# Altium footprint library GyokuRe.PcbLib: 1248 footprints (part 69 of 78)
Each footprint in its own frame and in the unit in brackets; x right, y up, seen from the top. Pads: shape width x height; smd on the part's side, far side on the other; paste and mask are expansions set on the pad; w line width, h text height; cw(c..) or ccw(c..) is an arc to the next point about the centre after c.
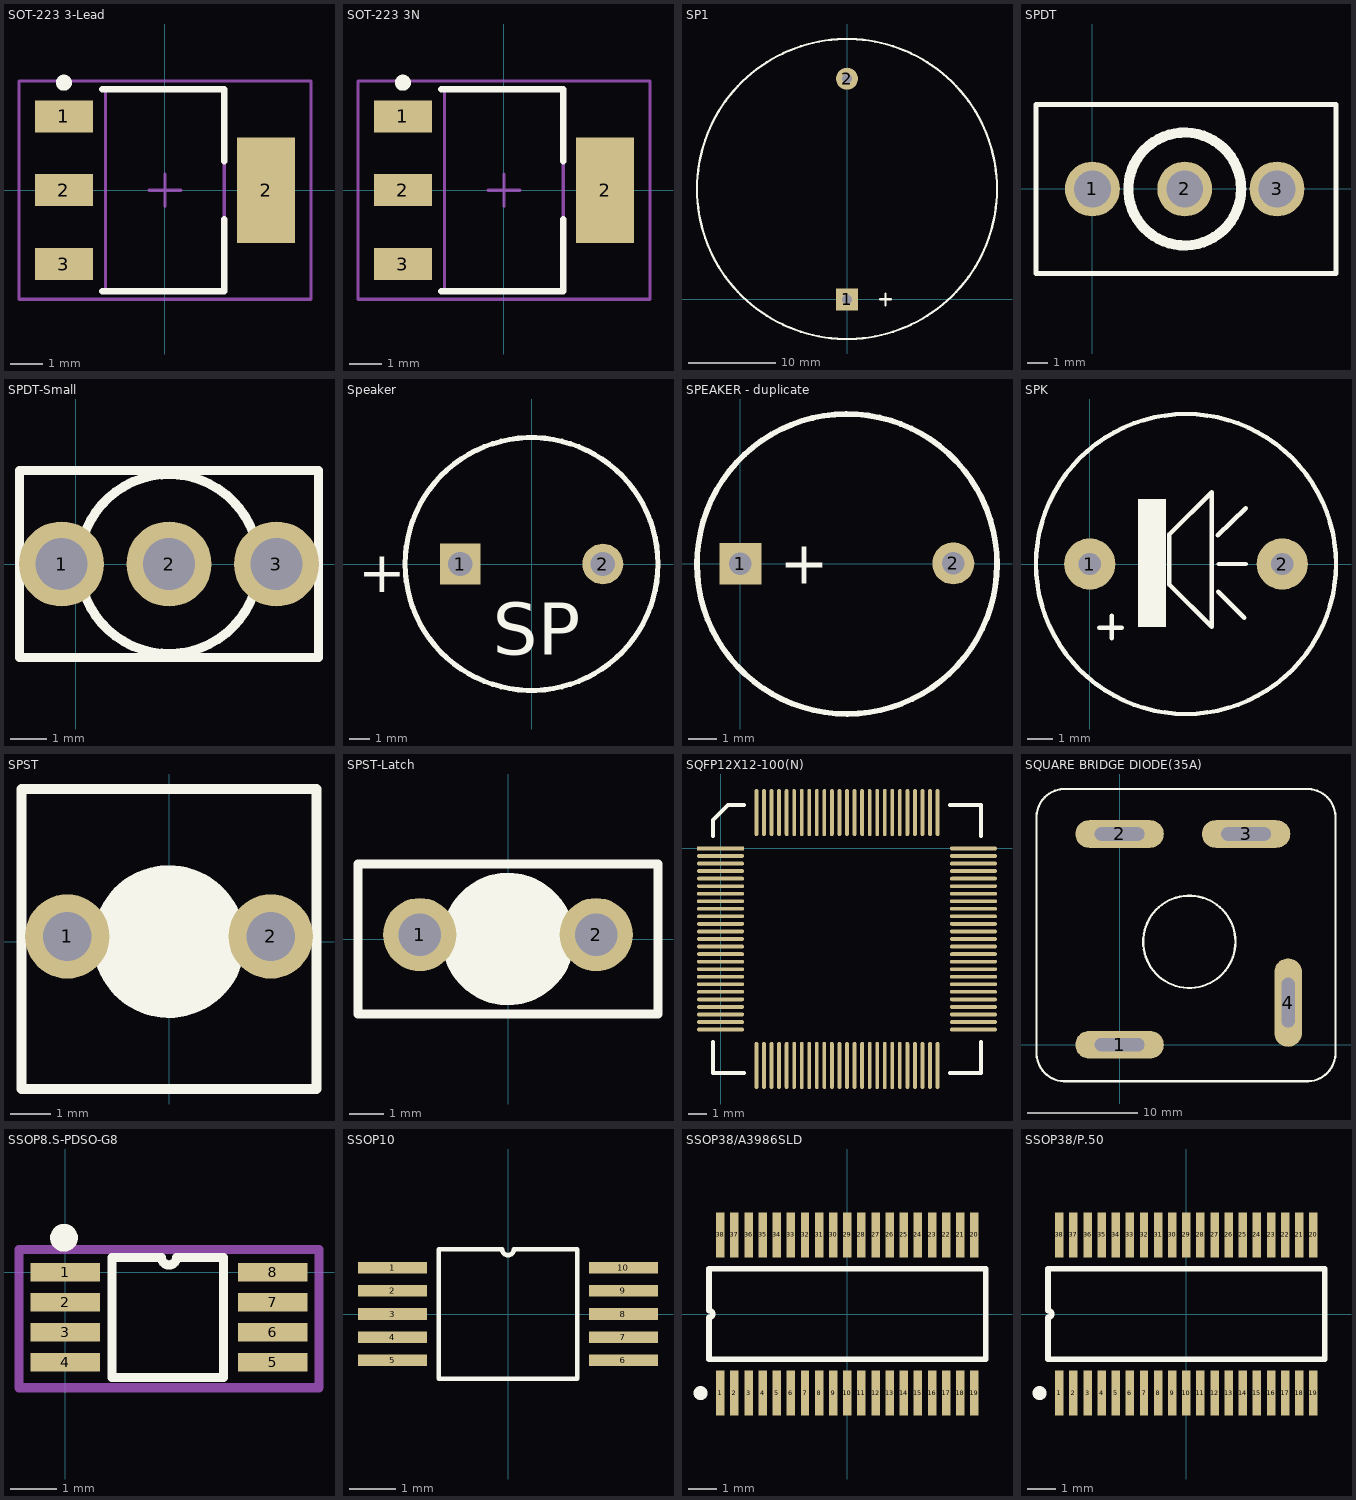
[diagram p68: the footprints below, top view; thin cyan lines are the x and y axes]

## SOT-223 3-Lead [mm]
height 1.8
pads (4):
  rect 1.8x1 smd: 1(-3.15,2.3) 2(-3.15,0) 3(-3.15,-2.3)
  rect 1.8x3.3 smd: 2(3.15,0)
Top Overlay:
  circle w0.25: c-3.15,3.35 r0.125
  lines w0.2: -1.95,-3.15 1.85,-3.15 1.85,-0.9 ; -1.95,3.15 1.85,3.15 1.85,0.9
Mechanical 13:
  lines w0.1: -1.85,-3.15 -1.85,3.15 1.85,3.15 1.85,-3.15 -1.85,-3.15
Mechanical 15:
  lines w0.1: -0.5,0 0.5,0 ; 0,-0.5 0,0.5 ; -4.55,-3.4 -4.55,3.4 4.55,3.4 4.55,-3.4 -4.55,-3.4
3D body: height 0.33, standoff 0.01, extent 1.825,-1.5 3.575,1.5
3D body: height 0.33, standoff 0.01, extent -3.55,-2.675 -1.8,-1.925
3D body: height 0.33, standoff 0.01, extent -3.55,-0.375 -1.8,0.375
3D body: height 0.33, standoff 0.01, extent -3.55,1.925 -1.8,2.675
3D body: height 1.75, standoff 0.1, extent -1.85,-3.15 1.85,3.15

## SOT-223 3N [mm]
height 1.8
pads (4):
  rect 1.8x1 smd: 1(-3.15,2.3) 2(-3.15,0) 3(-3.15,-2.3)
  rect 1.8x3.3 smd: 2(3.15,0)
Top Overlay:
  circle w0.25: c-3.15,3.35 r0.125
  lines w0.2: -1.95,-3.15 1.85,-3.15 1.85,-0.9 ; -1.95,3.15 1.85,3.15 1.85,0.9
Mechanical 13:
  lines w0.1: -1.85,-3.15 -1.85,3.15 1.85,3.15 1.85,-3.15 -1.85,-3.15
Mechanical 15:
  lines w0.1: -0.5,0 0.5,0 ; 0,-0.5 0,0.5 ; -4.55,-3.4 -4.55,3.4 4.55,3.4 4.55,-3.4 -4.55,-3.4
3D body "SOT-223-1.STEP": height 1.69, standoff 0.04, extent -3.525,-3.25 3.475,3.25

## SP1 [mil] "Speaker Telphone on Broad"
height 3
pads (2):
  rect 100x100 hole 45: 1(0,0)
  round 100 hole 45: 2(0,1000)
Top Overlay:
  circle w10: c0,500 r680
  lines w10: 150,0 200,0 ; 174,-28 174,26
3D body "Sonitron-SCS-32 p10-DEFAULT.STEP": height 382.53, standoff -227.75, extent -666.7,-174.54 652.2,1144.36

## SPDT [mil] "Single-Pole, Double-Throw Switch; Solder Pad 35mil"
pads (3):
  round 107 hole 72: 1(0,0) 2(180,0) 3(360,0)
Top Overlay:
  circle w20: c180,0 r110
  lines w10: -110,-165 475,-165 475,165 -110,165 -110,-165
3D body "SW3dPS-SWITCH SPDT_O_N_O.STEP": height 1126.73, standoff -95, extent -70,-233.46 430,233.47

## SPDT-Small [mil] "Single-Pole, Double-Throw Switch, Small Type; Solder Pad 35mil"
pads (3):
  round 91 hole 56: 1(-15,0) 2(100,0) 3(215,0)
Top Overlay:
  circle w10: c100,0 r96
  lines w10: -60,-100 260,-100 260,100 -60,100 -60,-100

## Speaker [mm] "Speaker footprint"
pads (2):
  rect 2x2 hole 1.2: 1(-3.5,0)
  round 2 hole 1.2: 2(3.5,0)
Top Overlay:
  circle w0.254: c0,0 r6.2
  text "+" at -8.509,-1.397 h2.03
  text "SP" at -1.905,-4.445 h2.54
Bottom Overlay:
  circle w0.254: c-0.025,0 r6.228
3D body: height 10.02, standoff 10, extent -2.025,-2.025 2.025,2.025
3D body: height 10, standoff 1, extent -6.2,-6.2 6.2,6.2

## SPEAKER - duplicate [mm]
pads (2):
  rect 1.5x1.5 hole 0.8: 1(0,0)
  round 1.5 hole 0.8: 2(7.62,0.013)
Top Overlay:
  lines w0.203: 7.724,3.67 ccw(c3.816,-0.008) 7.76,3.632
  text "+" at 1.41,-0.711 h1.52
3D body "User Library-Buzzer WST-1203UX.step": height 4.5, standoff -9.65, extent -2.215,-6 13.239,6

## SPK [mil] "Speaker Chip"
height 500
pads (2):
  round 80 hole 35: 1(0,0) 2(300,0)
Top Overlay:
  circle w7: c150,0 r233.73
  rectangle: 75,-98 119,101
  lines w7: 15,-99 50,-99 ; 34,-116 34,-81 ; 199.52,44.52 243,87 ; 200,-43 241,-84 ; 201,0 243,0 ; 124,-32 190,-98 190,112 124,46 124,-32
3D body "Sonitron-SCS-17 P10-DEFAULT.STEP": height 343.51, standoff -267.12, extent -221,-354.14 511.28,378.14

## SPST [mil] "Single-Pole, Single-Throw Switch; 2 Leads; Solder Pad 35mil"
pads (2):
  round 83 hole 48: 1(-100,5) 2(100,5)
Top Overlay:
  circle w80: c0,0 r35
  lines w10: -145,-145 -145,150 145,150 145,-145 -145,-145

## SPST-Latch [mil] "Single-Pole, Single-Throw Switch; 2 Leads; Solder Pad 35mil"
pads (2):
  round 83 hole 48: 1(-100,5) 2(100,5)
Top Overlay:
  circle w80: c0,0 r35
  lines w10: -170,-85 170,-85 170,85 -170,85 -170,-85

## SQFP12X12-100(N) [mm]
pads (100):
  rect 2.5x0.2 smd: 1(0,0)
  oval 2.5x0.2 smd: 2(0,-0.4) 3(0,-0.8) 4(0,-1.2) 5(0,-1.6) 6(0,-2) 7(0,-2.4) 8(0,-2.8) 9(0,-3.2) 10(0,-3.6) 11(0,-4) 12(0,-4.4) 13(0,-4.8) 14(0,-5.2) 15(0,-5.6) 16(0,-6) 17(0,-6.4) 18(0,-6.8) 19(0,-7.2) 20(0,-7.6) 21(0,-8) 22(0,-8.4) 23(0,-8.8) 24(0,-9.2) 25(0,-9.6) 51(13.4,-9.6) 52(13.4,-9.2) 53(13.4,-8.8) 54(13.4,-8.4) 55(13.4,-8) 56(13.4,-7.6) 57(13.4,-7.2) 58(13.4,-6.8) 59(13.4,-6.4) 60(13.4,-6) 61(13.4,-5.6) 62(13.4,-5.2) 63(13.4,-4.8) 64(13.4,-4.4) 65(13.4,-4) 66(13.4,-3.6) 67(13.4,-3.2) 68(13.4,-2.8) 69(13.4,-2.4) 70(13.4,-2) 71(13.4,-1.6) 72(13.4,-1.2) 73(13.4,-0.8) 74(13.4,-0.4) 75(13.4,0)
  oval 0.2x2.5 smd: 26(1.9,-11.5) 27(2.3,-11.5) 28(2.7,-11.5) 29(3.1,-11.5) 30(3.5,-11.5) 31(3.9,-11.5) 32(4.3,-11.5) 33(4.7,-11.5) 34(5.1,-11.5) 35(5.5,-11.5) 36(5.9,-11.5) 37(6.3,-11.5) 38(6.7,-11.5) 39(7.1,-11.5) 40(7.5,-11.5) 41(7.9,-11.5) 42(8.3,-11.5) 43(8.7,-11.5) 44(9.1,-11.5) 45(9.5,-11.5) 46(9.9,-11.5) 47(10.3,-11.5) 48(10.7,-11.5) 49(11.1,-11.5) 50(11.5,-11.5) 76(11.5,1.9) 77(11.1,1.9) 78(10.7,1.9) 79(10.3,1.9) 80(9.9,1.9) 81(9.5,1.9) 82(9.1,1.9) 83(8.7,1.9) 84(8.3,1.9) 85(7.9,1.9) 86(7.5,1.9) 87(7.1,1.9) 88(6.7,1.9) 89(6.3,1.9) 90(5.9,1.9) 91(5.5,1.9) 92(5.1,1.9) 93(4.7,1.9) 94(4.3,1.9) 95(3.9,1.9) 96(3.5,1.9) 97(3.1,1.9) 98(2.7,1.9) 99(2.3,1.9) 100(1.9,1.9)
Top Overlay:
  lines w0.2: -0.4,-10.25 -0.4,-11.9 1.25,-11.9 ; -0.4,0.65 -0.4,1.5 0.4,2.3 1.25,2.3 ; 12.15,-11.9 13.8,-11.9 13.8,-10.25 ; 12.15,2.3 13.8,2.3 13.8,0.65

## SQUARE BRIDGE DIODE(35A) [mm]
pads (4):
  oval 8x2.5 hole 1.2 slot 4.5 at 0 deg: 1(0,0) 2(0,19.05) 3(11.43,19.05)
  oval 2.5x8 hole 1.2 slot 4.5 at 90 deg: 4(15.24,3.81)
Top Overlay:
  circle w0.2: c6.303,9.304 r4.17
  lines w0.2: -7.504,-0.6 ccw(c-4.952,-0.75) -4.802,-3.302 16.808,-3.302 ccw(c16.958,-0.75) 19.509,-0.6 19.509,20.41 ccw(c16.958,20.56) 16.808,23.111 -4.802,23.111 ccw(c-4.952,20.56) -7.504,20.41 -7.504,-0.6
3D body "User Library-SquareDiodeBridge-L.step": height 8.05, standoff -11, extent -8.281,-4.217 20.219,24.283

## SSOP8.S-PDSO-G8 [mm]
pads (8):
  rect 1.5x0.4 smd: 1(0,0) 2(0,-0.65) 3(0,-1.3) 4(0,-1.95) 5(4.5,-1.95) 6(4.5,-1.3) 7(4.5,-0.65) 8(4.5,0)
Top Overlay:
  lines w0.2: 1.016,-2.275 1.016,0.325 2.088,0.325 ccw(c2.25,0.325) 2.412,0.325 3.429,0.325 3.429,-2.275 1.016,-2.275
  lines w0.3: 0.125,0.75 cw(c-0.025,0.75) 0.124,0.767
Mechanical 13:
  lines w0.2: -1,-2.5 5.5,-2.5 5.5,0.5 -1,0.5 -1,-2.5
3D body: height 1.2, standoff 1.1, extent 1.049,-0.23 1.549,0.27
3D body: height 1.1, standoff 0, extent 0.75,-2.475 3.75,0.525
3D body: height 0.2, standoff 0, extent -0.25,-0.175 0.75,0.175
3D body: height 0.2, standoff 0, extent 3.75,-2.125 4.75,-1.775
3D body: height 0.2, standoff 0, extent -0.25,-0.825 0.75,-0.475
3D body: height 0.2, standoff 0, extent -0.25,-1.475 0.75,-1.125
3D body: height 0.2, standoff 0, extent -0.25,-2.125 0.75,-1.775
3D body: height 0.2, standoff 0, extent 3.75,-0.175 4.75,0.175
3D body: height 0.2, standoff 0, extent 3.75,-0.825 4.75,-0.475
3D body: height 0.2, standoff 0, extent 3.75,-1.475 4.75,-1.125

## SSOP10 [mm] "Shrink Small Outline; 10 Leads; Body Width 3 mm; Pitch 0.5 mm"
pads (10):
  rect 1.5x0.25 smd: 1(-2.5,1) 2(-2.5,0.5) 3(-2.5,0) 4(-2.5,-0.5) 5(-2.5,-1) 6(2.5,-1) 7(2.5,-0.5) 8(2.5,0) 9(2.5,0.5) 10(2.5,1)
Top Overlay:
  lines w0.1: -0.15,1.4 -1.5,1.4 -1.5,-1.4 1.5,-1.4 1.5,1.4 0.15,1.4 ; -0.125,1.4 ccw(c0,1.4) 0.125,1.4

## SSOP38/A3986SLD [mm] "Shrink Small Outline; 38 Leads; Body Width 4.4 mm; Pitch 0.5 mm"
height 1.2
pads (38):
  rect 0.3x1.6 smd: 1(-4.5,-2.8) 2(-4,-2.8) 3(-3.5,-2.8) 4(-3,-2.8) 5(-2.5,-2.8) 6(-2,-2.8) 7(-1.5,-2.8) 8(-1,-2.8) 9(-0.5,-2.8) 10(0,-2.8) 11(0.5,-2.8) 12(1,-2.8) 13(1.5,-2.8) 14(2,-2.8) 15(2.5,-2.8) 16(3,-2.8) 17(3.5,-2.8) 18(4,-2.8) 19(4.5,-2.8) 20(4.5,2.8) 21(4,2.8) 22(3.5,2.8) 23(3,2.8) 24(2.5,2.8) 25(2,2.8) 26(1.5,2.8) 27(1,2.8) 28(0.5,2.8) 29(0,2.8) 30(-0.5,2.8) 31(-1,2.8) 32(-1.5,2.8) 33(-2,2.8) 34(-2.5,2.8) 35(-3,2.8) 36(-3.5,2.8) 37(-4,2.8) 38(-4.5,2.8)
Top Overlay:
  circle w0.25: c-5.2,-2.8 r0.125
  lines w0.2: -4.9,-1.6 4.9,-1.6 4.9,1.6 -4.9,1.6 -4.9,0.125 cw(c-4.9,0) -4.9,-0.125 -4.9,-1.6

## SSOP38/P.50 [mm] "Shrink Small Outline; 38 Leads; Body Width 4.4 mm; Pitch 0.5 mm"
height 1.2
pads (38):
  rect 0.3x1.6 smd: 1(-4.5,-2.8) 2(-4,-2.8) 3(-3.5,-2.8) 4(-3,-2.8) 5(-2.5,-2.8) 6(-2,-2.8) 7(-1.5,-2.8) 8(-1,-2.8) 9(-0.5,-2.8) 10(0,-2.8) 11(0.5,-2.8) 12(1,-2.8) 13(1.5,-2.8) 14(2,-2.8) 15(2.5,-2.8) 16(3,-2.8) 17(3.5,-2.8) 18(4,-2.8) 19(4.5,-2.8) 20(4.5,2.8) 21(4,2.8) 22(3.5,2.8) 23(3,2.8) 24(2.5,2.8) 25(2,2.8) 26(1.5,2.8) 27(1,2.8) 28(0.5,2.8) 29(0,2.8) 30(-0.5,2.8) 31(-1,2.8) 32(-1.5,2.8) 33(-2,2.8) 34(-2.5,2.8) 35(-3,2.8) 36(-3.5,2.8) 37(-4,2.8) 38(-4.5,2.8)
Top Overlay:
  circle w0.25: c-5.2,-2.8 r0.125
  lines w0.2: -4.9,-1.6 -4.9,-0.125 ccw(c-4.9,0) -4.9,0.125 -4.9,1.6 4.9,1.6 4.9,-1.6 -4.9,-1.6